# Altium footprint library 20-Switches.PcbLib: 110 footprints (part 3 of 7)
Each footprint in its own frame and in the unit in brackets; x right, y up, seen from the top. Pads: shape width x height; smd on the part's side, far side on the other; paste and mask are expansions set on the pad; w line width, h text height; cw(c..) or ccw(c..) is an arc to the next point about the centre after c.
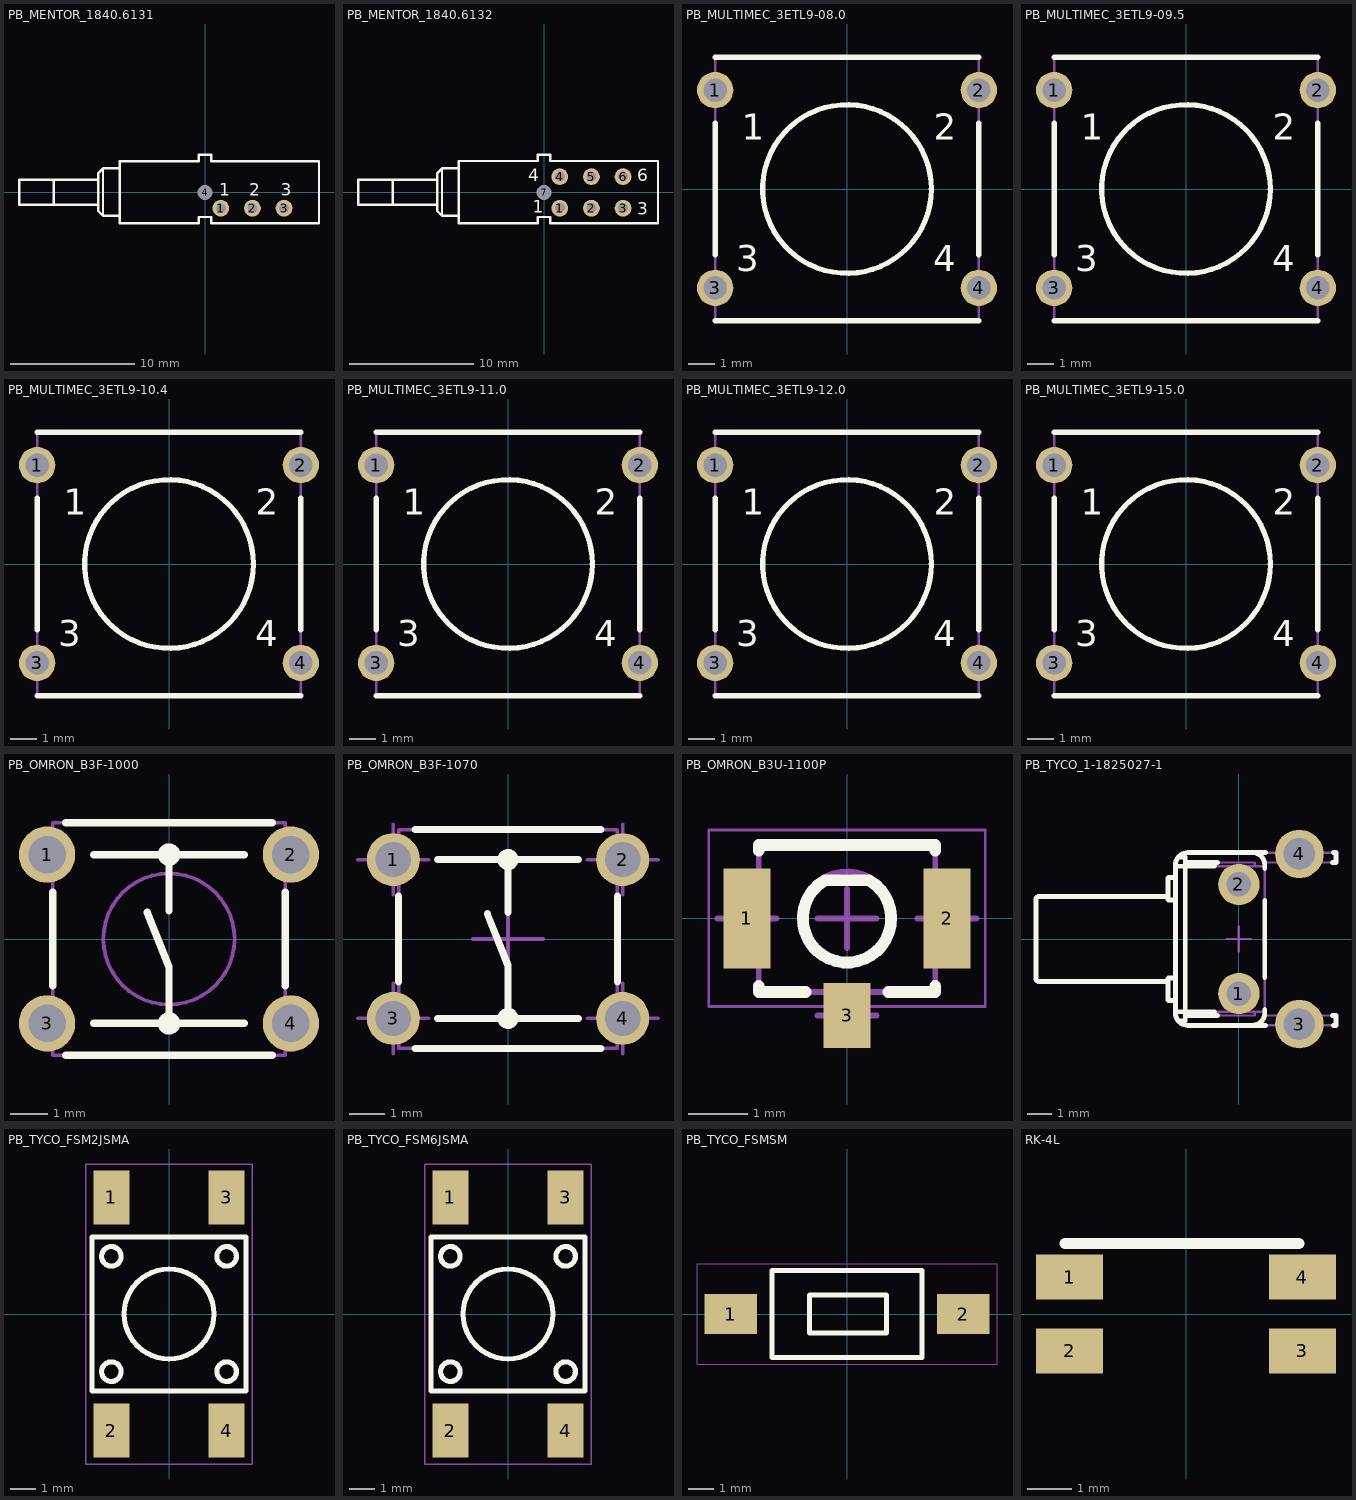
[diagram p2: the footprints below, top view; thin cyan lines are the x and y axes]

## PB_MENTOR_1840.6131 [mm] "SPDT Push-Button Switch - PCB Edge Mounting - MENTOR_1840.6131"
height 10.1
pads (4):
  round 1.35 hole 0.8: 1(1.27,-1.27) 2(3.81,-1.27) 3(6.35,-1.27)
  round 1 hole 1.2 unplated: 4(0,0)
Top Overlay:
  lines w0.2: -14.95,-0.979 -14.95,0.021 -14.95,1.021 ; -14.95,-0.975 -8.6,-0.975 ; -14.95,1.025 -8.6,1.025 ; -12.15,-0.975 -12.15,1.025 ; -6.84,-1.875 -8.2,-1.875 ; -6.84,1.925 -8.2,1.925 ; -8.2,-1.875 -8.6,-1.475 -8.6,1.525 -8.2,1.925 ; -8.2,-1.875 -8.2,1.925 ; -6.84,-2.475 -6.84,2.525 -0.5,2.525 -0.5,3.025 0.5,3.025 0.5,2.525 9.16,2.525 9.16,-2.475 0.5,-2.475 0.5,-1.975 -0.5,-1.975 -0.5,-2.475 -6.84,-2.475
  text "3" at 6.096,-0.254 h1
  text "1" at 1.143,-0.254 h1
  text "2" at 3.556,-0.254 h1
Mechanical 14:
  lines w0.1: -12.151,-0.974 -12.151,1.026 ; -8.601,-0.974 -14.951,-0.974 -14.951,0.026 -14.951,1.026 -8.601,1.026 ; -6.841,-1.874 -8.201,-1.874 ; -6.841,1.926 -8.201,1.926 ; -8.201,-1.874 -8.601,-1.474 -8.601,1.526 -8.201,1.926 ; -8.201,-1.874 -8.201,1.926 ; -6.841,-2.474 -6.841,2.526 -0.501,2.526 -0.501,3.026 0.499,3.026 0.499,2.526 9.159,2.526 9.159,-2.474 0.499,-2.474 0.499,-1.974 -0.501,-1.974 -0.501,-2.474 -6.841,-2.474
  text "3" at 6.095,-0.253 h1
  text "1" at 1.142,-0.253 h1
  text "2" at 3.555,-0.253 h1
3D body "PB_MENTOR_1840.6131.stp": height 10.1, standoff -4, extent -14.9,-2.5 9.16,3

## PB_MENTOR_1840.6132 [mm] "DPDT Push-Button Switch - PCB Edge Mounting - MENTOR_1840.6132"
height 10.1
pads (7):
  round 1.35 hole 0.8: 1(1.27,-1.27) 2(3.81,-1.27) 3(6.35,-1.27) 4(1.27,1.27) 5(3.81,1.27) 6(6.35,1.27)
  round 1 hole 1.2 unplated: 7(0,0)
Top Overlay:
  lines w0.2: -12.15,-0.975 -12.15,1.025 ; -8.6,-0.975 -14.95,-0.975 -14.95,0.025 -14.95,1.025 -8.6,1.025 ; -6.84,-1.875 -8.2,-1.875 ; -6.84,1.925 -8.2,1.925 ; -8.2,-1.875 -8.2,1.925 ; -8.2,-1.875 -8.6,-1.475 -8.6,1.525 -8.2,1.925 ; -6.84,-2.475 -0.5,-2.475 -0.5,-1.975 0.5,-1.975 0.5,-2.475 9.16,-2.475 9.16,2.525 0.5,2.525 0.5,3.025 -0.5,3.025 -0.5,2.525 -6.84,2.525 -6.84,-2.475
  text "1" at -0.889,-1.651 h1
  text "4" at -1.27,0.889 h1
  text "6" at 7.493,0.889 h1
  text "3" at 7.493,-1.778 h1
Mechanical 14:
  lines w0.1: -14.95,-0.975 -8.6,-0.975 ; -14.951,-0.971 -14.951,0.029 -14.951,1.029 ; -14.95,1.025 -8.6,1.025 ; -12.15,-0.975 -12.15,1.025 ; -6.84,-1.875 -8.2,-1.875 ; -6.84,1.925 -8.2,1.925 ; -8.2,-1.875 -8.2,1.925 ; -8.2,-1.875 -8.6,-1.475 -8.6,1.525 -8.2,1.925 ; -6.84,-2.475 -0.5,-2.475 -0.5,-1.975 0.5,-1.975 0.5,-2.475 9.16,-2.475 9.16,2.525 0.5,2.525 0.5,3.025 -0.5,3.025 -0.5,2.525 -6.84,2.525 -6.84,-2.475
  text "1" at -0.889,-1.651 h1
  text "4" at -1.27,0.889 h1
  text "6" at 7.493,0.889 h1
  text "3" at 7.493,-1.778 h1
3D body "PB_MENTOR_1840.6132.stp": height 10.1, standoff -4, extent -14.9,-2.5 9.16,3

## PB_MULTIMEC_3ETL9-08.0 [mm] "Body 10.1x10.1mm, Pushbutton Switch, MULTIMEC 3ETL9-08.0"
height 8
pads (4):
  round 1.4 hole 0.9: 1(-5.08,3.81) 2(5.08,3.81) 3(-5.08,-3.81) 4(5.08,-3.81)
Top Overlay:
  circle w0.2: c0,0 r3.25
  lines w0.2: -5.08,-5.08 5.08,-5.08 ; -5.08,-2.54 -5.08,2.54 ; -5.08,5.08 5.08,5.08 ; 5.08,-2.54 5.08,2.54
  text "2" at 3.344,1.905 h1
  text "4" at 3.32,-3.175 h1
  text "3" at -4.276,-3.175 h1
  text "1" at -4.058,1.905 h1
Mechanical 14:
  circle w0.1: c0,0 r3.25
  lines w0.1: -5.08,-4.2 -5.48,-4.2 -5.48,-3.4 -5.08,-3.4 ; -5.08,3.4 -5.48,3.4 -5.48,4.2 -5.08,4.2 ; 5.08,-4.21 5.48,-4.21 5.48,-3.41 5.08,-3.41 ; 5.08,3.41 5.48,3.41 5.48,4.21 5.08,4.21 ; -5.08,-5.08 5.08,-5.08 5.08,5.08 -5.08,5.08 -5.08,-5.08
  text "2" at 3.344,1.905 h1
  text "4" at 3.32,-3.175 h1
  text "3" at -4.276,-3.175 h1
  text "1" at -4.058,1.905 h1
3D body "PB_MULTIMEC_3ETL9-08.stp": height 13.1, standoff -3.6, extent -5.23,-5.05 5.23,5.05

## PB_MULTIMEC_3ETL9-09.5 [mm] "Body 10.1x10.1mm, Pushbutton Switch, MULTIMEC 3ETL9-09.5"
height 9.5
pads (4):
  round 1.4 hole 0.9: 1(-5.08,3.81) 2(5.08,3.81) 3(-5.08,-3.81) 4(5.08,-3.81)
Top Overlay:
  circle w0.2: c0,0 r3.25
  lines w0.2: -5.08,-5.08 5.08,-5.08 ; -5.08,-2.54 -5.08,2.54 ; -5.08,5.08 5.08,5.08 ; 5.08,-2.54 5.08,2.54
  text "2" at 3.344,1.905 h1
  text "4" at 3.32,-3.175 h1
  text "3" at -4.276,-3.175 h1
  text "1" at -4.058,1.905 h1
Mechanical 14:
  circle w0.1: c0,0 r3.25
  lines w0.1: -5.08,-4.21 -5.48,-4.21 -5.48,-3.41 -5.08,-3.41 ; -5.08,3.41 -5.48,3.41 -5.48,4.21 -5.08,4.21 ; 5.08,-4.21 5.48,-4.21 5.48,-3.41 5.08,-3.41 ; 5.08,3.41 5.48,3.41 5.48,4.21 5.08,4.21 ; -5.08,-5.08 5.08,-5.08 5.08,5.08 -5.08,5.08 -5.08,-5.08
  text "2" at 3.344,1.905 h1
  text "4" at 3.32,-3.175 h1
  text "3" at -4.276,-3.175 h1
  text "1" at -4.058,1.905 h1
3D body "PB_MULTIMEC_3ETL9-09.stp": height 14.6, standoff -3.6, extent -5.23,-5.05 5.23,5.05

## PB_MULTIMEC_3ETL9-10.4 [mm] "Body 10.1x10.1mm, Pushbutton Switch, MULTIMEC 3ETL9-10.4"
height 10.4
pads (4):
  round 1.4 hole 0.9: 1(-5.08,3.81) 2(5.08,3.81) 3(-5.08,-3.81) 4(5.08,-3.81)
Top Overlay:
  circle w0.2: c0,0 r3.25
  lines w0.2: -5.08,-5.08 5.08,-5.08 ; -5.08,-2.54 -5.08,2.54 ; -5.08,5.08 5.08,5.08 ; 5.08,-2.54 5.08,2.54
  text "2" at 3.344,1.905 h1
  text "4" at 3.32,-3.175 h1
  text "3" at -4.276,-3.175 h1
  text "1" at -4.058,1.905 h1
Mechanical 14:
  circle w0.1: c0,0 r3.25
  lines w0.1: -5.08,-4.21 -5.48,-4.21 -5.48,-3.41 -5.08,-3.41 ; -5.08,3.41 -5.48,3.41 -5.48,4.21 -5.08,4.21 ; 5.08,-4.21 5.48,-4.21 5.48,-3.41 5.08,-3.41 ; 5.08,3.41 5.48,3.41 5.48,4.21 5.08,4.21 ; -5.08,-5.08 5.08,-5.08 5.08,5.08 -5.08,5.08 -5.08,-5.08
  text "2" at 3.344,1.905 h1
  text "4" at 3.32,-3.175 h1
  text "3" at -4.276,-3.175 h1
  text "1" at -4.058,1.905 h1
3D body "PB_MULTIMEC_3ETL9-10.stp": height 15.5, standoff -3.6, extent -5.23,-5.05 5.23,5.05

## PB_MULTIMEC_3ETL9-11.0 [mm] "Body 10.1x10.1mm, Pushbutton Switch, MULTIMEC 3ETL9-11.0"
height 11
pads (4):
  round 1.4 hole 0.9: 1(-5.08,3.81) 2(5.08,3.81) 3(-5.08,-3.81) 4(5.08,-3.81)
Top Overlay:
  circle w0.2: c0,0 r3.25
  lines w0.2: -5.08,-5.08 5.08,-5.08 ; -5.08,-2.54 -5.08,2.54 ; -5.08,5.08 5.08,5.08 ; 5.08,-2.54 5.08,2.54
  text "1" at -4.058,1.905 h1
  text "3" at -4.276,-3.175 h1
  text "4" at 3.32,-3.175 h1
  text "2" at 3.344,1.905 h1
Mechanical 14:
  circle w0.1: c0,0 r3.25
  lines w0.1: -5.08,-4.21 -5.48,-4.21 -5.48,-3.41 -5.08,-3.41 ; -5.08,3.41 -5.48,3.41 -5.48,4.21 -5.08,4.21 ; 5.08,-4.21 5.48,-4.21 5.48,-3.41 5.08,-3.41 ; 5.08,3.41 5.48,3.41 5.48,4.21 5.08,4.21 ; -5.08,-5.08 -5.08,5.08 5.08,5.08 5.08,-5.08 -5.08,-5.08
  text "1" at -4.058,1.905 h1
  text "3" at -4.276,-3.175 h1
  text "4" at 3.32,-3.175 h1
  text "2" at 3.344,1.905 h1
3D body "PB_MULTIMEC_3ETL9-11.stp": height 16.1, standoff -3.6, extent -5.23,-5.05 5.23,5.05

## PB_MULTIMEC_3ETL9-12.0 [mm] "Body 10.1x10.1mm, Pushbutton Switch, MULTIMEC 3ETL9-12.0"
height 12
pads (4):
  round 1.4 hole 0.9: 1(-5.08,3.81) 2(5.08,3.81) 3(-5.08,-3.81) 4(5.08,-3.81)
Top Overlay:
  circle w0.2: c0,0 r3.25
  lines w0.2: -5.08,-5.08 5.08,-5.08 ; -5.08,-2.54 -5.08,2.54 ; -5.08,5.08 5.08,5.08 ; 5.08,-2.54 5.08,2.54
  text "2" at 3.344,1.905 h1
  text "4" at 3.32,-3.175 h1
  text "3" at -4.276,-3.175 h1
  text "1" at -4.058,1.905 h1
Mechanical 14:
  circle w0.1: c0,0 r3.25
  lines w0.1: -5.08,-4.21 -5.48,-4.21 -5.48,-3.41 -5.08,-3.41 ; -5.08,3.41 -5.48,3.41 -5.48,4.21 -5.08,4.21 ; 5.08,-4.21 5.48,-4.21 5.48,-3.41 5.08,-3.41 ; 5.08,3.41 5.48,3.41 5.48,4.21 5.08,4.21 ; -5.08,-5.08 5.08,-5.08 5.08,5.08 -5.08,5.08 -5.08,-5.08
  text "2" at 3.344,1.905 h1
  text "4" at 3.32,-3.175 h1
  text "3" at -4.276,-3.175 h1
  text "1" at -4.058,1.905 h1
3D body "PB_MULTIMEC_3ETL9-12.stp": height 17.1, standoff -3.6, extent -5.23,-5.05 5.23,5.05

## PB_MULTIMEC_3ETL9-15.0 [mm] "Body 10.1x10.1mm, Pushbutton Switch, MULTIMEC 3ETL9-15.0"
height 15
pads (4):
  round 1.4 hole 0.9: 1(-5.08,3.81) 2(5.08,3.81) 3(-5.08,-3.81) 4(5.08,-3.81)
Top Overlay:
  circle w0.2: c0,0 r3.25
  lines w0.2: -5.08,-5.08 5.08,-5.08 ; -5.08,-2.54 -5.08,2.54 ; -5.08,5.08 5.08,5.08 ; 5.08,-2.54 5.08,2.54
  text "1" at -4.058,1.905 h1
  text "3" at -4.276,-3.175 h1
  text "4" at 3.32,-3.175 h1
  text "2" at 3.344,1.905 h1
Mechanical 14:
  circle w0.1: c0,0 r3.25
  lines w0.1: -5.08,-4.21 -5.48,-4.21 -5.48,-3.41 -5.08,-3.41 ; -5.08,3.41 -5.48,3.41 -5.48,4.21 -5.08,4.21 ; 5.08,-4.21 5.48,-4.21 5.48,-3.41 5.08,-3.41 ; 5.08,3.41 5.48,3.41 5.48,4.21 5.08,4.21 ; -5.08,-5.08 -5.08,5.08 5.08,5.08 5.08,-5.08 -5.08,-5.08
  text "1" at -4.058,1.905 h1
  text "3" at -4.276,-3.175 h1
  text "4" at 3.32,-3.175 h1
  text "2" at 3.344,1.905 h1
3D body "PB_MULTIMEC_3ETL9-15.stp": height 20.1, standoff -3.6, extent -5.23,-5.05 5.23,5.05

## PB_OMRON_B3F-1000 [mm] "6x6mm Model, Horizontal, Flat Plunger Type (without Ground Terminal) Pushbutton Switch, OMRON B3F Series"
height 4.5
pads (4):
  round 1.5 hole 1: 1(-3.25,2.25) 2(3.25,2.25) 3(-3.25,-2.25) 4(3.25,-2.25)
Top Overlay:
  circle w0.2: c0,-2.25 r0.2
  circle w0.2: c0,2.25 r0.2
  lines w0.2: -3.1,-1.25 -3.1,1.25 ; -2.75,-3.1 2.75,-3.1 ; -2.75,3.1 2.75,3.1 ; -2,-2.25 2,-2.25 ; -2,2.25 2,2.25 ; -0.586,0.716 0,-0.75 0,-2.25 ; 0,0.75 0,2.25 ; 3.1,-1.25 3.1,1.25
Mechanical 14:
  circle w0.1: c0,0 r1.75
  lines w0.1: -3.1,-2.6 -3.4,-2.6 -3.4,-1.9 -3.1,-1.9 ; -3.1,1.9 -3.4,1.9 -3.4,2.6 -3.1,2.6 ; 3.1,-2.6 3.4,-2.6 3.4,-1.9 3.1,-1.9 ; 3.1,1.9 3.4,1.9 3.4,2.6 3.1,2.6 ; -3.1,-3.1 -3.1,3.1 3.1,3.1 3.1,-3.1 -3.1,-3.1
3D body "PB_OMRON_B3F-1000.stp": height 4.3, standoff -3.6, extent -3.4,-3.1 3.4,3.1

## PB_OMRON_B3F-1070 [mm] "6x6mm Model, Horizontal, Flat Plunger Type (without Ground Terminal) Pushbutton Switch, OMRON B3F Series"
height 9.5
pads (4):
  round 1.5 hole 1: 1(-3.25,2.25) 2(3.25,2.25) 3(-3.25,-2.25) 4(3.25,-2.25)
Top Overlay:
  circle w0.2: c0,-2.25 r0.2
  circle w0.2: c0,2.25 r0.2
  lines w0.2: -3.1,-1.211 -3.1,1.211 ; -2.634,-3.1 2.634,-3.1 ; -2.634,3.1 2.634,3.1 ; -2,-2.25 2,-2.25 ; -2,2.25 2,2.25 ; -0.586,0.716 0,-0.75 0,-2.25 ; 0,0.75 0,2.25 ; 3.1,-1.211 3.1,1.211
Mechanical 8:
  lines w0.1: -4.25,-2.25 -3.25,-2.25 ; -4.25,2.25 -3.25,2.25 ; -3.25,-3.25 -3.25,-2.25 ; -3.25,-1.25 -3.25,-2.25 ; -3.25,1.25 -3.25,2.25 ; -3.25,3.25 -3.25,2.25 ; -2.25,-2.25 -3.25,-2.25 ; -2.25,2.25 -3.25,2.25 ; -1,0 0,0 ; 0,-1 0,0 ; 0,1 0,0 ; 1,0 0,0 ; 2.25,-2.25 3.25,-2.25 ; 2.25,2.25 3.25,2.25 ; 3.25,-3.25 3.25,-2.25 ; 3.25,-1.25 3.25,-2.25 ; 3.25,1.25 3.25,2.25 ; 3.25,3.25 3.25,2.25 ; 4.25,-2.25 3.25,-2.25 ; 4.25,2.25 3.25,2.25
Mechanical 14:
  circle w0.1: c0,-2.25 r0.1
  circle w0.1: c0,2.25 r0.1
  lines w0.1: -3.1,-2.6 -3.4,-2.6 -3.4,-1.9 -3.1,-1.9 ; -3.1,1.9 -3.4,1.9 -3.4,2.6 -3.1,2.6 ; -2,-2.25 2,-2.25 ; -2,2.25 2,2.25 ; -0.586,0.716 0,-0.75 0,-2.25 ; 0,0.75 0,2.25 ; 3.1,-2.6 3.4,-2.6 3.4,-1.9 3.1,-1.9 ; 3.1,1.9 3.4,1.9 3.4,2.6 3.1,2.6 ; -3.1,-3.1 3.1,-3.1 3.1,3.1 -3.1,3.1 -3.1,-3.1
3D body "m20-254via.stp": height 0.1, standoff -1.82, extent 2.4,-3.1 4.1,-1.4
3D body "m20-254via.stp": height 0.1, standoff -1.82, extent 2.4,1.4 4.1,3.1
3D body "m20-254via.stp": height 0.1, standoff -1.82, extent -4.1,-3.1 -2.4,-1.4
3D body "m20-254via.stp": height 0.1, standoff -1.82, extent -4.1,1.4 -2.4,3.1
3D body "PB_OMRON_B3F-1070.stp": height 9.5, standoff -3.6, extent -3.4,-3.1 3.4,3.1

## PB_OMRON_B3U-1100P [mm] "Body 1.2x3x2.5mm Ultra-Small Tactile Pushbutton Switch, (with Ground Terminal), OMRON B3U Series"
height 1.75
pads (3):
  rect 0.8x1.7 smd: 1(-1.7,0) 2(1.7,0)
  rect 0.8x1.1 smd: 3(0,-1.65)
Top Overlay:
  lines w0.2: -1.5,-1.15 -1.5,-1.25 -0.7,-1.25 ; -1.5,1.15 -1.5,1.25 1.5,1.25 1.5,1.15 ; 0.7,-1.25 1.5,-1.25 1.5,-1.15 ; -0.374,0.65 ccw(c0,0) 0.374,0.65 -0.374,0.65
Mechanical 8:
  lines w0.1: -2.2,0 -1.7,0 ; -1.7,-0.5 -1.7,0 ; -1.7,0.5 -1.7,0 ; -1.2,0 -1.7,0 ; -0.5,-1.65 0,-1.65 ; -0.5,0 0,0 ; 0,-2.15 0,-1.65 ; 0,-1.15 0,-1.65 ; 0,-0.5 0,0 ; 0,0.5 0,0 ; 0.5,-1.65 0,-1.65 ; 0.5,0 0,0 ; 1.2,0 1.7,0 ; 1.7,-0.5 1.7,0 ; 1.7,0.5 1.7,0 ; 2.2,0 1.7,0
Mechanical 14:
  circle w0.1: c0,0 r0.8
  lines w0.1: -1.505,-0.701 -2.006,-0.701 -2.006,0.701 -1.505,0.701 ; -0.251,-1.25 -0.251,-1.959 0.251,-1.959 0.251,-1.25 ; 1.505,-0.701 2.006,-0.701 2.006,0.701 1.505,0.701 ; -1.5,-1.25 1.5,-1.25 1.5,1.25 -1.5,1.25 -1.5,-1.25 ; -0.374,0.65 ccw(c0,0) 0.374,0.65 -0.374,0.65
Mechanical 15:
  lines w0.05: -2.35,-1.5 -2.35,1.5 2.35,1.5 2.35,-1.5 -2.35,-1.5
3D body "PB_OMRON_B3U-1100P.stp": height 1.75, standoff 0, extent -2,-1.95 2,1.25

## PB_TYCO_1-1825027-1 [mm] "Right Angle Micro Miniature Tactile Pushbutton Switche, Round Actuator Length = 5.74mm, FSMRAJ Serie"
height 7.01
pads (4):
  round 1.7 hole 1: 1(0,-2.25) 2(0,2.25)
  round 2 hole 1.3: 3(2.49,-3.505) 4(2.49,3.505)
Top Overlay:
  lines w0.2: -2.921,-1.753 -8.23,-1.753 cw(c-8.23,-1.626) -8.357,-1.626 -8.357,1.626 cw(c-8.23,1.626) -8.23,1.753 -2.921,1.753 ; -2.616,-2.997 -2.21,-2.997 -1.002,-2.997 ; -2.616,-2.54 -2.87,-2.54 cw(c-2.87,-2.489) -2.921,-2.489 -2.921,-1.651 cw(c-2.87,-1.651) -2.87,-1.6 -2.616,-1.6 ; -2.616,1.6 -2.87,1.6 cw(c-2.87,1.651) -2.921,1.651 -2.921,2.489 cw(c-2.87,2.489) -2.87,2.54 -2.616,2.54 ; -2.616,2.997 -2.21,2.997 -1.002,2.997 ; -2.494,-3.378 -2.21,-3.378 -2.21,3.378 -2.494,3.378 ; -2.21,-3.15 -0.868,-3.15 ; -2.21,3.15 -0.868,3.15 ; 0.559,-3.556 ccw(c0.559,-3.048) 1.067,-3.048 ; 0.559,3.556 cw(c0.559,3.048) 1.067,3.048 ; 1.067,-3.15 1.067,-2.901 ; 1.067,-1.599 1.067,1.599 ; 1.067,2.901 1.067,3.15 ; 1.091,-3.556 -2.108,-3.556 cw(c-2.108,-3.048) -2.616,-3.048 -2.616,3.048 cw(c-2.108,3.048) -2.108,3.556 1.091,3.556 ; 3.844,-3.15 4.001,-3.15 4.001,-3.556 3.889,-3.556 ; 3.844,3.15 4.001,3.15 4.001,3.556 3.889,3.556
Mechanical 8:
  lines w0.1: -0.5,-2.25 0,-2.25 ; -0.5,0 0,0 ; -0.5,2.25 0,2.25 ; 0,-2.75 0,-2.25 ; 0,-1.75 0,-2.25 ; 0,-0.5 0,0 ; 0,0.5 0,0 ; 0,1.75 0,2.25 ; 0,2.75 0,2.25 ; 0.5,-2.25 0,-2.25 ; 0.5,0 0,0 ; 0.5,2.25 0,2.25 ; 1.99,-3.505 2.49,-3.505 ; 1.99,3.505 2.49,3.505 ; 2.49,-4.005 2.49,-3.505 ; 2.49,-3.005 2.49,-3.505 ; 2.49,3.005 2.49,3.505 ; 2.49,4.005 2.49,3.505 ; 2.99,-3.505 2.49,-3.505 ; 2.99,3.505 2.49,3.505
Mechanical 14:
  lines w0.1: -2.921,-1.753 -8.23,-1.753 cw(c-8.23,-1.626) -8.357,-1.626 -8.357,1.626 cw(c-8.23,1.626) -8.23,1.753 -2.921,1.753 ; -2.616,-2.997 -2.21,-2.997 1.067,-2.997 1.067,3.15 4.001,3.15 4.001,3.556 -2.108,3.556 ccw(c-2.108,3.048) -2.616,3.048 -2.616,-3.048 ccw(c-2.108,-3.048) -2.108,-3.556 4.001,-3.556 4.001,-3.15 1.067,-3.15 ; -2.616,-2.54 -2.87,-2.54 cw(c-2.87,-2.489) -2.921,-2.489 -2.921,-1.651 cw(c-2.87,-1.651) -2.87,-1.6 -2.616,-1.6 ; -2.616,1.6 -2.87,1.6 cw(c-2.87,1.651) -2.921,1.651 -2.921,2.489 cw(c-2.87,2.489) -2.87,2.54 -2.616,2.54 ; -2.616,2.997 -2.21,2.997 1.067,2.997 ; -2.494,-3.378 -2.21,-3.378 -2.21,3.378 -2.494,3.378 ; -2.21,-3.15 0.66,-3.15 0.66,-2.997 ; -2.21,3.15 0.66,3.15 0.66,2.997 ; 0.559,-3.556 ccw(c0.559,-3.048) 1.067,-3.048 ; 0.559,3.556 cw(c0.559,3.048) 1.067,3.048 ; 1.994,-3.556 1.994,-4.204 2.985,-4.204 2.985,-3.556 ; 1.994,3.556 1.994,4.204 2.985,4.204 2.985,3.556 ; 2.654,-3.556 2.654,-3.15 ; 2.654,3.15 2.654,3.556
3D body "PB_TYCO_1-1825027-1.stp": height 7.01, standoff -3.51, extent -8.356,-4.204 4.001,4.204

## PB_TYCO_FSM2JSMA [mm] "Body 6mm x 6mm, Surface Mount Tactile Switches, TYCO FSMJSMA Series"
height 4.59
pads (4):
  rect 1.4x2.1 smd: 1(-2.25,4.55) 2(-2.25,-4.55) 3(2.25,4.55) 4(2.25,-4.55)
Top Overlay:
  circle w0.2: c-2.248,-2.248 r0.381
  circle w0.2: c-2.248,2.248 r0.381
  circle w0.2: c2.248,-2.248 r0.381
  circle w0.2: c2.248,2.248 r0.381
  circle w0.2: c0,0 r1.753
  lines w0.2: -3,-3 3,-3 3,3 -3,3 -3,-3
Mechanical 14:
  circle w0.1: c-2.248,-2.248 r0.381
  circle w0.1: c-2.248,2.248 r0.381
  circle w0.1: c2.248,-2.248 r0.381
  circle w0.1: c2.248,2.248 r0.381
  circle w0.1: c0,0 r1.753
  lines w0.1: -3,-3 3,-3 3,3 -3,3 -3,-3
Mechanical 15:
  lines w0.05: -3.25,-5.85 3.25,-5.85 3.25,5.85 -3.25,5.85 -3.25,-5.85
3D body "PB_TYCO_FSM2JSMA.stp": height 4.39, standoff 0, extent -3,-5 3,5
3D body "fb-tfmarm.stp": height 0, standoff 0, extent -2.95,3.5 -1.55,5.6
3D body "fb-tfmarm.stp": height 0, standoff 0, extent 1.55,3.5 2.95,5.6
3D body "fb-tfmarm.stp": height 0, standoff 0, extent 1.55,-5.6 2.95,-3.5
3D body "fb-tfmarm.stp": height 0, standoff 0, extent -2.95,-5.6 -1.55,-3.5

## PB_TYCO_FSM6JSMA [mm] "Body 6mm x 6mm, Surface Mount Tactile Switches, TYCO FSM6JSMA Series"
height 7.11
pads (4):
  rect 1.4x2.1 smd: 1(-2.25,4.55) 2(-2.25,-4.55) 3(2.25,4.55) 4(2.25,-4.55)
Top Overlay:
  circle w0.2: c-2.248,-2.248 r0.381
  circle w0.2: c-2.248,2.248 r0.381
  circle w0.2: c2.248,-2.248 r0.381
  circle w0.2: c2.248,2.248 r0.381
  circle w0.2: c0,0 r1.753
  lines w0.2: -3,-3 3,-3 3,3 -3,3 -3,-3
Mechanical 14:
  circle w0.1: c-2.248,-2.248 r0.381
  circle w0.1: c-2.248,2.248 r0.381
  circle w0.1: c2.248,-2.248 r0.381
  circle w0.1: c2.248,2.248 r0.381
  circle w0.1: c0,0 r1.753
  lines w0.1: -3,-3 3,-3 3,3 -3,3 -3,-3
Mechanical 15:
  lines w0.05: -3.25,-5.85 3.25,-5.85 3.25,5.85 -3.25,5.85 -3.25,-5.85
3D body "fb-tfmarm.stp": height 0, standoff 0, extent 1.55,-5.6 2.95,-3.5
3D body "fb-tfmarm.stp": height 0, standoff 0, extent -2.95,-5.6 -1.55,-3.5
3D body "fb-tfmarm.stp": height 0, standoff 0, extent 1.55,3.5 2.95,5.6
3D body "fb-tfmarm.stp": height 0, standoff 0, extent -2.95,3.5 -1.55,5.6
3D body "PB_TYCO_FSM6JSMA.stp": height 7.11, standoff 0, extent -3,-5 3,5

## PB_TYCO_FSMSM [mm] "Body 3.5x6.0mm, Pushbutton Switch,  TYCO FSMSM Serie"
height 4.3
pads (2):
  rect 2.1x1.6 smd: 1(-4.65,0) 2(4.65,0)
Top Overlay:
  lines w0.2: -3,-1.75 3,-1.75 3,1.75 -3,1.75 -3,-1.75 ; -1.5,-0.75 1.575,-0.75 1.575,0.75 -1.5,0.75 -1.5,-0.75
Mechanical 14:
  lines w0.1: -3,-1.75 -3,1.75 3,1.75 3,-1.75 -3,-1.75 ; -1.5,-0.75 -1.5,0.75 1.575,0.75 1.575,-0.75 -1.5,-0.75
Mechanical 15:
  lines w0.05: -6,-2 6,-2 6,2 -6,2 -6,-2
3D body "PB_TYCO_FSMSM.stp": height 4.3, standoff 0, extent -5,-1.75 5,1.75

## RK-4L [mil]
height 169.29
pads (4):
  rect 60x40 smd mask+2: 1(-104,33) 4(104,33)
  rect 60x40 smd mask+0: 2(-104,-33) 3(104,-33)
Top Overlay:
  lines w10: -108,63 101,63
3D body "uk-smt4.stp": height 112.2, standoff 0, extent -95.87,-73 95.87,52.35